# Altium schematic symbol library jlcpcb_2025_04_inductors_extended_0805.schlib: 882 symbols (part 3 of 5) (continued)
## LQM21FN4R7M70L
designator L?  Inductance: 4.7uH
Inductor, 4.7uH, ±20%, 455mΩ, 120mA, SMD 0805; Manufacturer: Murata Electronics; Manufacturer Part Number: LQM21FN4R7M70L; Package Size: 0805; JLCPCB Basic Part: No; JLCPCB Part Number: C162583; Supplier 1: LCSC; Category: Inductors; Supplier Part Number 1: C162583; Tolerance: ±20%; Rated Current: 120mA; Saturation Current: 120mA; DC Resistance: 455mΩ; RoHS: Yes; ComponentLink1Description: Datasheet; ComponentLink1URL: https://wmsc.lcsc.com/wmsc/upload/file/pdf/v2/lcsc/2304140030_Murata-Electronics-LQM21FN4R7M70L_C162583.pdf; ComponentLink2Description: JLCPCB Part URL; ComponentLink2URL: https://jlcpcb.com/partdetail/C162583; ComponentLink3Description: LCSC Part URL; ComponentLink3URL: https://lcsc.com/product-detail/Inductors-SMD_Murata-Electronics-Murata-Electronics-LQM21FN4R7M70L_C162583.html
footprint IND-0805 (0805 (2012M) Inductor)
pins: 1, 2

## LQM21FN4R7M80L
designator L?  Inductance: 4.7uH
Inductor, 4.7uH, ±20%, 234mΩ, 120mA, SMD 0805; Manufacturer: Murata Electronics; Manufacturer Part Number: LQM21FN4R7M80L; Self-Resonant Frequency: 1MHz; Package Size: 0805; JLCPCB Basic Part: No; JLCPCB Part Number: C464406; Supplier 1: LCSC; Category: Inductors; Supplier Part Number 1: C464406; Tolerance: ±20%; Rated Current: 120mA; Saturation Current: 120mA; DC Resistance: 234mΩ; RoHS: Yes; ComponentLink1Description: Datasheet; ComponentLink1URL: https://wmsc.lcsc.com/wmsc/upload/file/pdf/v2/lcsc/1912111437_Murata-Electronics-LQM21FN4R7M80L_C464406.pdf; ComponentLink2Description: JLCPCB Part URL; ComponentLink2URL: https://jlcpcb.com/partdetail/C464406; ComponentLink3Description: LCSC Part URL; ComponentLink3URL: https://lcsc.com/product-detail/Inductors-SMD_Murata-Electronics-Murata-Electronics-LQM21FN4R7M80L_C464406.html
footprint IND-0805 (0805 (2012M) Inductor)
pins: 1, 2

## LQM21FN100M70L
designator L?  Inductance: 10uH
Inductor, 10uH, ±20%, 780mΩ, 100mA, SMD 0805; Manufacturer: Murata Electronics; Manufacturer Part Number: LQM21FN100M70L; Package Size: 0805; JLCPCB Basic Part: No; JLCPCB Part Number: C98030; Supplier 1: LCSC; Category: Inductors; Supplier Part Number 1: C98030; Tolerance: ±20%; Rated Current: 100mA; Saturation Current: 100mA; DC Resistance: 780mΩ; RoHS: Yes; ComponentLink1Description: Datasheet; ComponentLink1URL: https://wmsc.lcsc.com/wmsc/upload/file/pdf/v2/lcsc/1810201221_Murata-Electronics-LQM21FN100M70L_C98030.pdf; ComponentLink2Description: JLCPCB Part URL; ComponentLink2URL: https://jlcpcb.com/partdetail/C98030; ComponentLink3Description: LCSC Part URL; ComponentLink3URL: https://lcsc.com/product-detail/Inductors-SMD_Murata-Electronics-Murata-Electronics-LQM21FN100M70L_C98030.html
footprint IND-0805 (0805 (2012M) Inductor)
pins: 1, 2

## LQM21FN100M80L
designator L?  Inductance: 10uH
Inductor, 10uH, ±20%, 390mΩ, 100mA, SMD 0805; Manufacturer: Murata Electronics; Manufacturer Part Number: LQM21FN100M80L; Self-Resonant Frequency: 1MHz; Package Size: 0805; JLCPCB Basic Part: No; JLCPCB Part Number: C162582; Supplier 1: LCSC; Category: Inductors; Supplier Part Number 1: C162582; Tolerance: ±20%; Rated Current: 100mA; Saturation Current: 100mA; DC Resistance: 390mΩ; RoHS: Yes; ComponentLink1Description: Datasheet; ComponentLink1URL: https://wmsc.lcsc.com/wmsc/upload/file/pdf/v2/lcsc/2304140030_Murata-Electronics-LQM21FN100M80L_C162582.pdf; ComponentLink2Description: JLCPCB Part URL; ComponentLink2URL: https://jlcpcb.com/partdetail/C162582; ComponentLink3Description: LCSC Part URL; ComponentLink3URL: https://lcsc.com/product-detail/Inductors-SMD_Murata-Electronics-Murata-Electronics-LQM21FN100M80L_C162582.html
footprint IND-0805 (0805 (2012M) Inductor)
pins: 1, 2

## LQM21FN100N00L
designator L?  Inductance: 10uH
Inductor, 10uH, ±30%, 650mΩ, 60mA, SMD 0805; Manufacturer: Murata Electronics; Manufacturer Part Number: LQM21FN100N00L; Self-Resonant Frequency: 1MHz; Package Size: 0805; JLCPCB Basic Part: No; JLCPCB Part Number: C113094; Supplier 1: LCSC; Category: Inductors; Supplier Part Number 1: C113094; Tolerance: ±30%; Rated Current: 60mA; Saturation Current: 60mA; DC Resistance: 650mΩ; RoHS: Yes; ComponentLink1Description: Datasheet; ComponentLink1URL: https://wmsc.lcsc.com/wmsc/upload/file/pdf/v2/lcsc/2304140030_Murata-Electronics-LQM21FN100N00L_C113094.pdf; ComponentLink2Description: JLCPCB Part URL; ComponentLink2URL: https://jlcpcb.com/partdetail/C113094; ComponentLink3Description: LCSC Part URL; ComponentLink3URL: https://lcsc.com/product-detail/Inductors-SMD_Murata-Electronics-Murata-Electronics-LQM21FN100N00L_C113094.html
footprint IND-0805 (0805 (2012M) Inductor)
pins: 1, 2

## LQM21FN220N00L
designator L?  Inductance: 22uH
Inductor, 22uH, ±30%, 455mΩ, 13mA, SMD 0805; Manufacturer: Murata Electronics; Manufacturer Part Number: LQM21FN220N00L; Self-Resonant Frequency: 15MHz; Package Size: 0805; JLCPCB Basic Part: No; JLCPCB Part Number: C882482; Supplier 1: LCSC; Category: Inductors; Supplier Part Number 1: C882482; Tolerance: ±30%; Rated Current: 13mA; Saturation Current: 13mA; DC Resistance: 455mΩ; RoHS: Yes; ComponentLink1Description: Datasheet; ComponentLink1URL: https://wmsc.lcsc.com/wmsc/upload/file/pdf/v2/lcsc/2201242130_Murata-Electronics-LQM21FN220N00L_C882482.pdf; ComponentLink2Description: JLCPCB Part URL; ComponentLink2URL: https://jlcpcb.com/partdetail/C882482; ComponentLink3Description: LCSC Part URL; ComponentLink3URL: https://lcsc.com/product-detail/Inductors-SMD_Murata-Electronics-Murata-Electronics-LQM21FN220N00L_C882482.html
footprint IND-0805 (0805 (2012M) Inductor)
pins: 1, 2

## LQM21FN470N00L
designator L?  Inductance: 47uH
Inductor, 47uH, ±30%, 780mΩ, 7mA, SMD 0805; Manufacturer: Murata Electronics; Manufacturer Part Number: LQM21FN470N00L; Self-Resonant Frequency: 1MHz; Package Size: 0805; JLCPCB Basic Part: No; JLCPCB Part Number: C86087; Supplier 1: LCSC; Category: Inductors; Supplier Part Number 1: C86087; Tolerance: ±30%; Rated Current: 7mA; Saturation Current: 7mA; DC Resistance: 780mΩ; RoHS: Yes; ComponentLink1Description: Datasheet; ComponentLink1URL: https://wmsc.lcsc.com/wmsc/upload/file/pdf/v2/lcsc/1810201211_Murata-Electronics-LQM21FN470N00L_C86087.pdf; ComponentLink2Description: JLCPCB Part URL; ComponentLink2URL: https://jlcpcb.com/partdetail/C86087; ComponentLink3Description: LCSC Part URL; ComponentLink3URL: https://lcsc.com/product-detail/Inductors-SMD_Murata-Electronics-Murata-Electronics-LQM21FN470N00L_C86087.html
footprint IND-0805 (0805 (2012M) Inductor)
pins: 1, 2

## LQM21NN1R0K10D
designator L?  Inductance: 1uH
Inductor, 1uH, ±10%, 400mΩ, 50mA, SMD 0805; Manufacturer: Murata Electronics; Manufacturer Part Number: LQM21NN1R0K10D; Self-Resonant Frequency: 107MHz; Q Factor: 45@10MHz; Package Size: 0805; JLCPCB Basic Part: No; JLCPCB Part Number: C882481; Supplier 1: LCSC; Category: Inductors; Supplier Part Number 1: C882481; Tolerance: ±10%; Rated Current: 50mA; DC Resistance: 400mΩ; RoHS: Yes; ComponentLink1Description: Datasheet; ComponentLink1URL: https://wmsc.lcsc.com/wmsc/upload/file/pdf/v2/lcsc/2201242130_Murata-Electronics-LQM21NN1R0K10D_C882481.pdf; ComponentLink2Description: JLCPCB Part URL; ComponentLink2URL: https://jlcpcb.com/partdetail/C882481; ComponentLink3Description: LCSC Part URL; ComponentLink3URL: https://lcsc.com/product-detail/Inductors-SMD_Murata-Electronics-Murata-Electronics-LQM21NN1R0K10D_C882481.html
footprint IND-0805 (0805 (2012M) Inductor)
pins: 1, 2

## LQM21NN1R2K10D
designator L?  Inductance: 1.2uH
Inductor, 1.2uH, ±10%, 470mΩ, 50mA, SMD 0805; Manufacturer: Murata Electronics; Manufacturer Part Number: LQM21NN1R2K10D; Self-Resonant Frequency: 97MHz; Q Factor: 45@10MHz; Package Size: 0805; JLCPCB Basic Part: No; JLCPCB Part Number: C882480; Supplier 1: LCSC; Category: Inductors; Supplier Part Number 1: C882480; Tolerance: ±10%; Rated Current: 50mA; DC Resistance: 470mΩ; RoHS: Yes; ComponentLink1Description: Datasheet; ComponentLink1URL: https://wmsc.lcsc.com/wmsc/upload/file/pdf/v2/lcsc/2201242130_Murata-Electronics-LQM21NN1R2K10D_C882480.pdf; ComponentLink2Description: JLCPCB Part URL; ComponentLink2URL: https://jlcpcb.com/partdetail/C882480; ComponentLink3Description: LCSC Part URL; ComponentLink3URL: https://lcsc.com/product-detail/Inductors-SMD_Murata-Electronics-Murata-Electronics-LQM21NN1R2K10D_C882480.html
footprint IND-0805 (0805 (2012M) Inductor)
pins: 1, 2

## LQM21NN1R5K10D
designator L?  Inductance: 1.5uH
Inductor, 1.5uH, ±10%, 500mΩ, 50mA, SMD 0805; Manufacturer: Murata Electronics; Manufacturer Part Number: LQM21NN1R5K10D; Q Factor: 45@10MHz; Package Size: 0805; JLCPCB Basic Part: No; JLCPCB Part Number: C307605; Supplier 1: LCSC; Category: Inductors; Supplier Part Number 1: C307605; Tolerance: ±10%; Rated Current: 50mA; DC Resistance: 500mΩ; RoHS: Yes; ComponentLink1Description: Datasheet; ComponentLink1URL: https://wmsc.lcsc.com/wmsc/upload/file/pdf/v2/lcsc/2304140030_Murata-Electronics-LQM21NN1R5K10D_C307605.pdf; ComponentLink2Description: JLCPCB Part URL; ComponentLink2URL: https://jlcpcb.com/partdetail/C307605; ComponentLink3Description: LCSC Part URL; ComponentLink3URL: https://lcsc.com/product-detail/Inductors-SMD_Murata-Electronics-Murata-Electronics-LQM21NN1R5K10D_C307605.html
footprint IND-0805 (0805 (2012M) Inductor)
pins: 1, 2

## LQM21NN1R8K10D
designator L?  Inductance: 1.8uH
Inductor, 1.8uH, ±10%, 570mΩ, 50mA, SMD 0805; Manufacturer: Murata Electronics; Manufacturer Part Number: LQM21NN1R8K10D; Self-Resonant Frequency: 80MHz; Q Factor: 45@10MHz; Package Size: 0805; JLCPCB Basic Part: No; JLCPCB Part Number: C337912; Supplier 1: LCSC; Category: Inductors; Supplier Part Number 1: C337912; Tolerance: ±10%; Rated Current: 50mA; DC Resistance: 570mΩ; RoHS: Yes; ComponentLink1Description: Datasheet; ComponentLink1URL: https://wmsc.lcsc.com/wmsc/upload/file/pdf/v2/lcsc/2304140030_Murata-Electronics-LQM21NN1R8K10D_C337912.pdf; ComponentLink2Description: JLCPCB Part URL; ComponentLink2URL: https://jlcpcb.com/partdetail/C337912; ComponentLink3Description: LCSC Part URL; ComponentLink3URL: https://lcsc.com/product-detail/Inductors-SMD_Murata-Electronics-Murata-Electronics-LQM21NN1R8K10D_C337912.html
footprint IND-0805 (0805 (2012M) Inductor)
pins: 1, 2

## LQM21NN2R2K10D
designator L?  Inductance: 2.2uH
Inductor, 2.2uH, ±10%, 630mΩ, 30mA, SMD 0805; Manufacturer: Murata Electronics; Manufacturer Part Number: LQM21NN2R2K10D; Self-Resonant Frequency: 71MHz; Q Factor: 45@10MHz; Package Size: 0805; JLCPCB Basic Part: No; JLCPCB Part Number: C440235; Supplier 1: LCSC; Category: Inductors; Supplier Part Number 1: C440235; Tolerance: ±10%; Rated Current: 30mA; DC Resistance: 630mΩ; RoHS: Yes; ComponentLink1Description: Datasheet; ComponentLink1URL: https://wmsc.lcsc.com/wmsc/upload/file/pdf/v2/lcsc/2304140030_Murata-Electronics-LQM21NN2R2K10D_C440235.pdf; ComponentLink2Description: JLCPCB Part URL; ComponentLink2URL: https://jlcpcb.com/partdetail/C440235; ComponentLink3Description: LCSC Part URL; ComponentLink3URL: https://lcsc.com/product-detail/Inductors-SMD_Murata-Electronics-Murata-Electronics-LQM21NN2R2K10D_C440235.html
footprint IND-0805 (0805 (2012M) Inductor)
pins: 1, 2

## LQM21NN3R3K10L
designator L?  Inductance: 3.3uH
Inductor, 3.3uH, ±10%, 800mΩ, 30mA, SMD 0805; Manufacturer: Murata Electronics; Manufacturer Part Number: LQM21NN3R3K10L; Self-Resonant Frequency: 59MHz; Q Factor: 45@10MHz; Package Size: 0805; JLCPCB Basic Part: No; JLCPCB Part Number: C440236; Supplier 1: LCSC; Category: Inductors; Supplier Part Number 1: C440236; Tolerance: ±10%; Rated Current: 30mA; DC Resistance: 800mΩ; RoHS: Yes; ComponentLink1Description: Datasheet; ComponentLink1URL: https://wmsc.lcsc.com/wmsc/upload/file/pdf/v2/lcsc/2304140030_Murata-Electronics-LQM21NN3R3K10L_C440236.pdf; ComponentLink2Description: JLCPCB Part URL; ComponentLink2URL: https://jlcpcb.com/partdetail/C440236; ComponentLink3Description: LCSC Part URL; ComponentLink3URL: https://lcsc.com/product-detail/Inductors-SMD_Murata-Electronics-Murata-Electronics-LQM21NN3R3K10L_C440236.html
footprint IND-0805 (0805 (2012M) Inductor)
pins: 1, 2

## LQM21NN4R7K10L
designator L?  Inductance: 4.7uH
Inductor, 4.7uH, ±10%, 1Ω, 30mA, SMD 0805; Manufacturer: Murata Electronics; Manufacturer Part Number: LQM21NN4R7K10L; Self-Resonant Frequency: 10MHz; Q Factor: 45@10MHz; Package Size: 0805; JLCPCB Basic Part: No; JLCPCB Part Number: C113097; Supplier 1: LCSC; Category: Inductors; Supplier Part Number 1: C113097; Tolerance: ±10%; Rated Current: 30mA; DC Resistance: 1Ω; RoHS: Yes; ComponentLink1Description: Datasheet; ComponentLink1URL: https://wmsc.lcsc.com/wmsc/upload/file/pdf/v2/lcsc/2304140030_Murata-Electronics-LQM21NN4R7K10L_C113097.pdf; ComponentLink2Description: JLCPCB Part URL; ComponentLink2URL: https://jlcpcb.com/partdetail/C113097; ComponentLink3Description: LCSC Part URL; ComponentLink3URL: https://lcsc.com/product-detail/Inductors-SMD_Murata-Electronics-Murata-Electronics-LQM21NN4R7K10L_C113097.html
footprint IND-0805 (0805 (2012M) Inductor)
pins: 1, 2

## LQM21NNR22K10D
designator L?  Inductance: 220nH
Inductor, 220nH, ±10%, 380mΩ, 250mA, SMD 0805; Manufacturer: Murata Electronics; Manufacturer Part Number: LQM21NNR22K10D; Self-Resonant Frequency: 220MHz; Q Factor: 20@25MHz; Package Size: 0805; JLCPCB Basic Part: No; JLCPCB Part Number: C882477; Supplier 1: LCSC; Category: Inductors; Supplier Part Number 1: C882477; Tolerance: ±10%; Rated Current: 250mA; DC Resistance: 380mΩ; RoHS: Yes; ComponentLink1Description: Datasheet; ComponentLink1URL: https://wmsc.lcsc.com/wmsc/upload/file/pdf/v2/lcsc/2304140030_Murata-Electronics-LQM21NNR22K10D_C882477.pdf; ComponentLink2Description: JLCPCB Part URL; ComponentLink2URL: https://jlcpcb.com/partdetail/C882477; ComponentLink3Description: LCSC Part URL; ComponentLink3URL: https://lcsc.com/product-detail/Inductors-SMD_Murata-Electronics-Murata-Electronics-LQM21NNR22K10D_C882477.html
footprint IND-0805 (0805 (2012M) Inductor)
pins: 1, 2

## LQM21NNR27K10D
designator L?  Inductance: 270nH
Inductor, 270nH, ±10%, 420mΩ, 250mA, SMD 0805; Manufacturer: Murata Electronics; Manufacturer Part Number: LQM21NNR27K10D; Self-Resonant Frequency: 200MHz; Q Factor: 20@25MHz; Package Size: 0805; JLCPCB Basic Part: No; JLCPCB Part Number: C723885; Supplier 1: LCSC; Category: Inductors; Supplier Part Number 1: C723885; Tolerance: ±10%; Rated Current: 250mA; DC Resistance: 420mΩ; RoHS: Yes; ComponentLink1Description: Datasheet; ComponentLink1URL: https://wmsc.lcsc.com/wmsc/upload/file/pdf/v2/lcsc/2304140030_Murata-Electronics-LQM21NNR27K10D_C723885.pdf; ComponentLink2Description: JLCPCB Part URL; ComponentLink2URL: https://jlcpcb.com/partdetail/C723885; ComponentLink3Description: LCSC Part URL; ComponentLink3URL: https://lcsc.com/product-detail/Inductors-SMD_Murata-Electronics-Murata-Electronics-LQM21NNR27K10D_C723885.html
footprint IND-0805 (0805 (2012M) Inductor)
pins: 1, 2

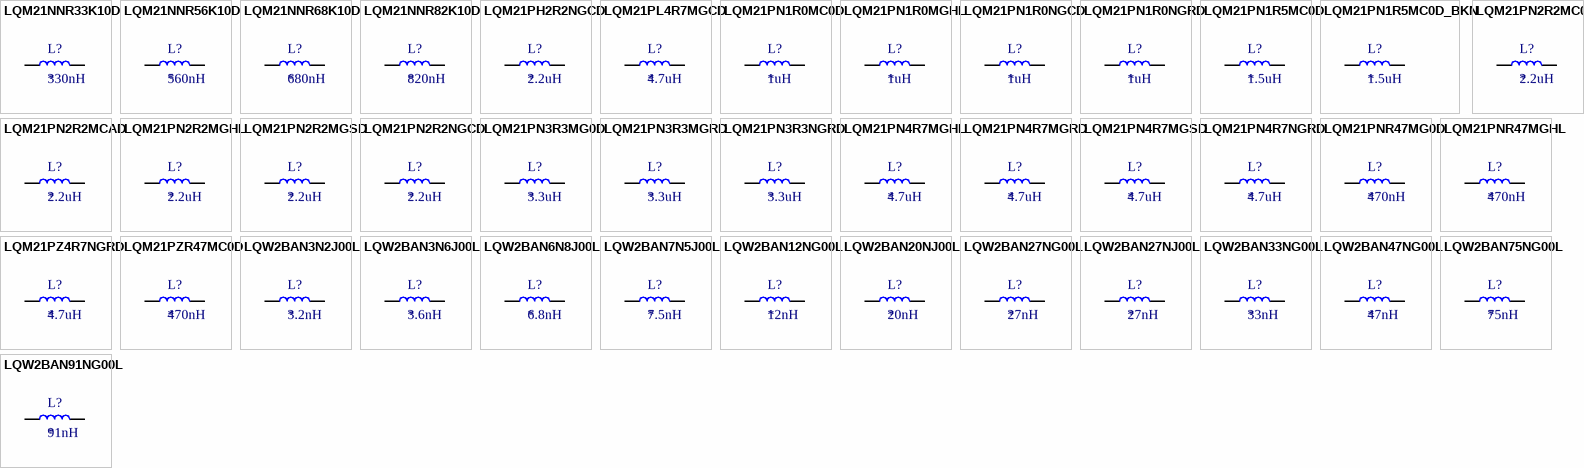
[diagram p11: symbols LQM21NNR33K10D to LQW2BAN91NG00L]

## LQM21NNR33K10D
designator L?  Inductance: 330nH
Inductor, 330nH, ±10%, 480mΩ, 250mA, SMD 0805; Manufacturer: Murata Electronics; Manufacturer Part Number: LQM21NNR33K10D; Self-Resonant Frequency: 180MHz; Q Factor: 20@25MHz; Package Size: 0805; JLCPCB Basic Part: No; JLCPCB Part Number: C882476; Supplier 1: LCSC; Category: Inductors; Supplier Part Number 1: C882476; Tolerance: ±10%; Rated Current: 250mA; DC Resistance: 480mΩ; RoHS: Yes; ComponentLink1Description: Datasheet; ComponentLink1URL: https://wmsc.lcsc.com/wmsc/upload/file/pdf/v2/lcsc/2304140030_Murata-Electronics-LQM21NNR33K10D_C882476.pdf; ComponentLink2Description: JLCPCB Part URL; ComponentLink2URL: https://jlcpcb.com/partdetail/C882476; ComponentLink3Description: LCSC Part URL; ComponentLink3URL: https://lcsc.com/product-detail/Inductors-SMD_Murata-Electronics-Murata-Electronics-LQM21NNR33K10D_C882476.html
footprint IND-0805 (0805 (2012M) Inductor)
pins: 1, 2

## LQM21NNR56K10D
designator L?  Inductance: 560nH
Inductor, 560nH, ±10%, 630mΩ, 150mA, SMD 0805; Manufacturer: Murata Electronics; Manufacturer Part Number: LQM21NNR56K10D; Self-Resonant Frequency: 140MHz; Q Factor: 25@25MHz; Package Size: 0805; JLCPCB Basic Part: No; JLCPCB Part Number: C882475; Supplier 1: LCSC; Category: Inductors; Supplier Part Number 1: C882475; Tolerance: ±10%; Rated Current: 150mA; DC Resistance: 630mΩ; RoHS: Yes; ComponentLink1Description: Datasheet; ComponentLink1URL: https://wmsc.lcsc.com/wmsc/upload/file/pdf/v2/lcsc/2304140030_Murata-Electronics-LQM21NNR56K10D_C882475.pdf; ComponentLink2Description: JLCPCB Part URL; ComponentLink2URL: https://jlcpcb.com/partdetail/C882475; ComponentLink3Description: LCSC Part URL; ComponentLink3URL: https://lcsc.com/product-detail/Inductors-SMD_Murata-Electronics-Murata-Electronics-LQM21NNR56K10D_C882475.html
footprint IND-0805 (0805 (2012M) Inductor)
pins: 1, 2

## LQM21NNR68K10D
designator L?  Inductance: 680nH
Inductor, 680nH, ±10%, 720mΩ, 150mA, SMD 0805; Manufacturer: Murata Electronics; Manufacturer Part Number: LQM21NNR68K10D; Self-Resonant Frequency: 25MHz; Q Factor: 25@25MHz; Package Size: 0805; JLCPCB Basic Part: No; JLCPCB Part Number: C113099; Supplier 1: LCSC; Category: Inductors; Supplier Part Number 1: C113099; Tolerance: ±10%; Rated Current: 150mA; DC Resistance: 720mΩ; RoHS: Yes; ComponentLink1Description: Datasheet; ComponentLink1URL: https://wmsc.lcsc.com/wmsc/upload/file/pdf/v2/lcsc/1810201223_Murata-Electronics-LQM21NNR68K10D_C113099.pdf; ComponentLink2Description: JLCPCB Part URL; ComponentLink2URL: https://jlcpcb.com/partdetail/C113099; ComponentLink3Description: LCSC Part URL; ComponentLink3URL: https://lcsc.com/product-detail/Inductors-SMD_Murata-Electronics-Murata-Electronics-LQM21NNR68K10D_C113099.html
footprint IND-0805 (0805 (2012M) Inductor)
pins: 1, 2

## LQM21NNR82K10D
designator L?  Inductance: 820nH
Inductor, 820nH, ±10%, 810mΩ, 150mA, SMD 0805; Manufacturer: Murata Electronics; Manufacturer Part Number: LQM21NNR82K10D; Self-Resonant Frequency: 25MHz; Q Factor: 25@25MHz; Package Size: 0805; JLCPCB Basic Part: No; JLCPCB Part Number: C98032; Supplier 1: LCSC; Category: Inductors; Supplier Part Number 1: C98032; Tolerance: ±10%; Rated Current: 150mA; DC Resistance: 810mΩ; RoHS: Yes; ComponentLink1Description: Datasheet; ComponentLink1URL: https://wmsc.lcsc.com/wmsc/upload/file/pdf/v2/lcsc/2304140030_Murata-Electronics-LQM21NNR82K10D_C98032.pdf; ComponentLink2Description: JLCPCB Part URL; ComponentLink2URL: https://jlcpcb.com/partdetail/C98032; ComponentLink3Description: LCSC Part URL; ComponentLink3URL: https://lcsc.com/product-detail/Inductors-SMD_Murata-Electronics-Murata-Electronics-LQM21NNR82K10D_C98032.html
footprint IND-0805 (0805 (2012M) Inductor)
pins: 1, 2

## LQM21PH2R2NGCD
designator L?  Inductance: 2.2uH
Inductor, 2.2uH, ±30%, 230mΩ, 800mA, SMD 0805; Manufacturer: Murata Electronics; Manufacturer Part Number: LQM21PH2R2NGCD; Self-Resonant Frequency: 40MHz; Package Size: 0805; JLCPCB Basic Part: No; JLCPCB Part Number: C2042634; Supplier 1: LCSC; Category: Inductors; Supplier Part Number 1: C2042634; Tolerance: ±30%; Rated Current: 800mA; DC Resistance: 230mΩ; RoHS: Yes; ComponentLink1Description: Datasheet; ComponentLink1URL: https://wmsc.lcsc.com/wmsc/upload/file/pdf/v2/lcsc/2202010030_Murata-Electronics-LQM21PH2R2NGCD_C2042634.pdf; ComponentLink2Description: JLCPCB Part URL; ComponentLink2URL: https://jlcpcb.com/partdetail/C2042634; ComponentLink3Description: LCSC Part URL; ComponentLink3URL: https://lcsc.com/product-detail/Inductors-SMD_Murata-Electronics-Murata-Electronics-LQM21PH2R2NGCD_C2042634.html
footprint IND-0805 (0805 (2012M) Inductor)
pins: 1, 2

## LQM21PL4R7MGCD
designator L?  Inductance: 4.7uH
Inductor, 4.7uH, ±20%, 812mΩ, 500mA, SMD 0805; Manufacturer: Murata Electronics; Manufacturer Part Number: LQM21PL4R7MGCD; Package Size: 0805; JLCPCB Basic Part: No; JLCPCB Part Number: C86088; Supplier 1: LCSC; Category: Inductors; Supplier Part Number 1: C86088; Tolerance: ±20%; Rated Current: 500mA; DC Resistance: 812mΩ; RoHS: Yes; ComponentLink1Description: Datasheet; ComponentLink1URL: https://wmsc.lcsc.com/wmsc/upload/file/pdf/v2/lcsc/1810201210_Murata-Electronics-LQM21PL4R7MGCD_C86088.pdf; ComponentLink2Description: JLCPCB Part URL; ComponentLink2URL: https://jlcpcb.com/partdetail/C86088; ComponentLink3Description: LCSC Part URL; ComponentLink3URL: https://lcsc.com/product-detail/Inductors-SMD_Murata-Electronics-Murata-Electronics-LQM21PL4R7MGCD_C86088.html
footprint IND-0805 (0805 (2012M) Inductor)
pins: 1, 2

## LQM21PN1R0MC0D
designator L?  Inductance: 1uH
Inductor, 1uH, ±20%, 238mΩ, 800mA, SMD 0805; Manufacturer: Murata Electronics; Manufacturer Part Number: LQM21PN1R0MC0D; Package Size: 0805; JLCPCB Basic Part: No; JLCPCB Part Number: C113100; Supplier 1: LCSC; Category: Inductors; Supplier Part Number 1: C113100; Tolerance: ±20%; Rated Current: 800mA; DC Resistance: 238mΩ; RoHS: Yes; ComponentLink1Description: Datasheet; ComponentLink1URL: https://wmsc.lcsc.com/wmsc/upload/file/pdf/v2/lcsc/2304140030_Murata-Electronics-LQM21PN1R0MC0D_C113100.pdf; ComponentLink2Description: JLCPCB Part URL; ComponentLink2URL: https://jlcpcb.com/partdetail/C113100; ComponentLink3Description: LCSC Part URL; ComponentLink3URL: https://lcsc.com/product-detail/Inductors-SMD_Murata-Electronics-Murata-Electronics-LQM21PN1R0MC0D_C113100.html
footprint IND-0805 (0805 (2012M) Inductor)
pins: 1, 2

## LQM21PN1R0MGHL
designator L?  Inductance: 1uH
Inductor, 1uH, ±20%, 80mΩ, 1.1A, SMD 0805; Manufacturer: Murata Electronics; Manufacturer Part Number: LQM21PN1R0MGHL; Self-Resonant Frequency: 60MHz; Package Size: 0805; JLCPCB Basic Part: No; JLCPCB Part Number: C703134; Supplier 1: LCSC; Category: Inductors; Supplier Part Number 1: C703134; Tolerance: ±20%; Rated Current: 1.1A; Saturation Current: 1.1A; DC Resistance: 80mΩ; RoHS: Yes; ComponentLink1Description: Datasheet; ComponentLink1URL: https://wmsc.lcsc.com/wmsc/upload/file/pdf/v2/lcsc/2304140030_Murata-Electronics-LQM21PN1R0MGHL_C703134.pdf; ComponentLink2Description: JLCPCB Part URL; ComponentLink2URL: https://jlcpcb.com/partdetail/C703134; ComponentLink3Description: LCSC Part URL; ComponentLink3URL: https://lcsc.com/product-detail/Inductors-SMD_Murata-Electronics-Murata-Electronics-LQM21PN1R0MGHL_C703134.html
footprint IND-0805 (0805 (2012M) Inductor)
pins: 1, 2

## LQM21PN1R0NGCD
designator L?  Inductance: 1uH
Inductor, 1uH, ±30%, 100mΩ, 900mA, SMD 0805; Manufacturer: Murata Electronics; Manufacturer Part Number: LQM21PN1R0NGCD; Self-Resonant Frequency: 50MHz; Package Size: 0805; JLCPCB Basic Part: No; JLCPCB Part Number: C703746; Supplier 1: LCSC; Category: Inductors; Supplier Part Number 1: C703746; Tolerance: ±30%; Rated Current: 900mA; DC Resistance: 100mΩ; RoHS: Yes; ComponentLink1Description: Datasheet; ComponentLink1URL: https://wmsc.lcsc.com/wmsc/upload/file/pdf/v2/lcsc/2304140030_Murata-Electronics-LQM21PN1R0NGCD_C703746.pdf; ComponentLink2Description: JLCPCB Part URL; ComponentLink2URL: https://jlcpcb.com/partdetail/C703746; ComponentLink3Description: LCSC Part URL; ComponentLink3URL: https://lcsc.com/product-detail/Inductors-SMD_Murata-Electronics-Murata-Electronics-LQM21PN1R0NGCD_C703746.html
footprint IND-0805 (0805 (2012M) Inductor)
pins: 1, 2

## LQM21PN1R0NGRD
designator L?  Inductance: 1uH
Inductor, 1uH, ±30%, 66mΩ, 700mA, SMD 0805; Manufacturer: Murata Electronics; Manufacturer Part Number: LQM21PN1R0NGRD; Self-Resonant Frequency: 50MHz; Package Size: 0805; JLCPCB Basic Part: No; JLCPCB Part Number: C703146; Supplier 1: LCSC; Category: Inductors; Supplier Part Number 1: C703146; Tolerance: ±30%; Rated Current: 700mA; DC Resistance: 66mΩ; RoHS: Yes; ComponentLink1Description: Datasheet; ComponentLink1URL: https://wmsc.lcsc.com/wmsc/upload/file/pdf/v2/lcsc/2304140030_Murata-Electronics-LQM21PN1R0NGRD_C703146.pdf; ComponentLink2Description: JLCPCB Part URL; ComponentLink2URL: https://jlcpcb.com/partdetail/C703146; ComponentLink3Description: LCSC Part URL; ComponentLink3URL: https://lcsc.com/product-detail/Inductors-SMD_Murata-Electronics-Murata-Electronics-LQM21PN1R0NGRD_C703146.html
footprint IND-0805 (0805 (2012M) Inductor)
pins: 1, 2

## LQM21PN1R5MC0D
designator L?  Inductance: 1.5uH
Inductor, 1.5uH, ±20%, 260mΩ, 700mA, SMD 0805; Manufacturer: Murata Electronics; Manufacturer Part Number: LQM21PN1R5MC0D; Self-Resonant Frequency: 70MHz; Package Size: 0805; JLCPCB Basic Part: No; JLCPCB Part Number: C576541; Supplier 1: LCSC; Category: Inductors; Supplier Part Number 1: C576541; Tolerance: ±20%; Rated Current: 700mA; DC Resistance: 260mΩ; RoHS: Yes; ComponentLink1Description: Datasheet; ComponentLink1URL: https://wmsc.lcsc.com/wmsc/upload/file/pdf/v2/lcsc/2304140030_Murata-Electronics-LQM21PN1R5MC0D_C576541.pdf; ComponentLink2Description: JLCPCB Part URL; ComponentLink2URL: https://jlcpcb.com/partdetail/C576541; ComponentLink3Description: LCSC Part URL; ComponentLink3URL: https://lcsc.com/product-detail/Inductors-SMD_Murata-Electronics-Murata-Electronics-LQM21PN1R5MC0D_C576541.html
footprint IND-0805 (0805 (2012M) Inductor)
pins: 1, 2

## LQM21PN1R5MC0D_BKN
designator L?  Inductance: 1.5uH
Inductor, 1.5uH, ±20%, 325mΩ, 700mA, SMD 0805; Manufacturer: Murata Electronics; Manufacturer Part Number: LQM21PN1R5MC0D/BKN; Package Size: 0805; JLCPCB Basic Part: No; JLCPCB Part Number: C184208; Supplier 1: LCSC; Category: Inductors; Supplier Part Number 1: C184208; Tolerance: ±20%; Rated Current: 700mA; DC Resistance: 325mΩ; RoHS: Yes; ComponentLink1Description: Datasheet; ComponentLink1URL: https://wmsc.lcsc.com/wmsc/upload/file/pdf/v2/lcsc/1810201251_Murata-Electronics-LQM21PN1R5MC0D-BKN_C184208.pdf; ComponentLink2Description: JLCPCB Part URL; ComponentLink2URL: https://jlcpcb.com/partdetail/C184208; ComponentLink3Description: LCSC Part URL; ComponentLink3URL: https://lcsc.com/product-detail/Inductors-SMD_Murata-Electronics-Murata-Electronics-LQM21PN1R5MC0D-BKN_C184208.html
footprint IND-0805 (0805 (2012M) Inductor)
pins: 1, 2

## LQM21PN2R2MC0D
designator L?  Inductance: 2.2uH
Inductor, 2.2uH, ±20%, 425mΩ, 600mA, SMD 0805; Manufacturer: Murata Electronics; Manufacturer Part Number: LQM21PN2R2MC0D; Self-Resonant Frequency: 1MHz; Package Size: 0805; JLCPCB Basic Part: No; JLCPCB Part Number: C98033; Supplier 1: LCSC; Category: Inductors; Supplier Part Number 1: C98033; Tolerance: ±20%; Rated Current: 600mA; DC Resistance: 425mΩ; RoHS: Yes; ComponentLink1Description: Datasheet; ComponentLink1URL: https://wmsc.lcsc.com/wmsc/upload/file/pdf/v2/lcsc/1810201234_Murata-Electronics-LQM21PN2R2MC0D_C98033.pdf; ComponentLink2Description: JLCPCB Part URL; ComponentLink2URL: https://jlcpcb.com/partdetail/C98033; ComponentLink3Description: LCSC Part URL; ComponentLink3URL: https://lcsc.com/product-detail/Inductors-SMD_Murata-Electronics-Murata-Electronics-LQM21PN2R2MC0D_C98033.html
footprint IND-0805 (0805 (2012M) Inductor)
pins: 1, 2

## LQM21PN2R2MCAD
designator L?  Inductance: 2.2uH
Inductor, 2.2uH, ±20%, 200mΩ, SMD 0805; Manufacturer: Murata Electronics; Manufacturer Part Number: LQM21PN2R2MCAD; Saturation Current: 300mA; Self-Resonant Frequency: 40MHz; Package Size: 0805; JLCPCB Basic Part: No; JLCPCB Part Number: C703745; Supplier 1: LCSC; Category: Inductors; Supplier Part Number 1: C703745; Tolerance: ±20%; DC Resistance: 200mΩ; RoHS: Yes; ComponentLink1Description: Datasheet; ComponentLink1URL: https://wmsc.lcsc.com/wmsc/upload/file/pdf/v2/lcsc/2304140030_Murata-Electronics-LQM21PN2R2MCAD_C703745.pdf; ComponentLink2Description: JLCPCB Part URL; ComponentLink2URL: https://jlcpcb.com/partdetail/C703745; ComponentLink3Description: LCSC Part URL; ComponentLink3URL: https://lcsc.com/product-detail/Inductors-SMD_Murata-Electronics-Murata-Electronics-LQM21PN2R2MCAD_C703745.html
footprint IND-0805 (0805 (2012M) Inductor)
pins: 1, 2

## LQM21PN2R2MGHL
designator L?  Inductance: 2.2uH
Inductor, 2.2uH, ±20%, 125mΩ, 1.3A, SMD 0805; Manufacturer: Murata Electronics; Manufacturer Part Number: LQM21PN2R2MGHL; Saturation Current: 450mA; Self-Resonant Frequency: 40MHz; Package Size: 0805; JLCPCB Basic Part: No; JLCPCB Part Number: C341781; Supplier 1: LCSC; Category: Inductors; Supplier Part Number 1: C341781; Tolerance: ±20%; Rated Current: 1.3A; DC Resistance: 125mΩ; RoHS: Yes; ComponentLink1Description: Datasheet; ComponentLink1URL: https://wmsc.lcsc.com/wmsc/upload/file/pdf/v2/lcsc/2304140030_Murata-Electronics-LQM21PN2R2MGHL_C341781.pdf; ComponentLink2Description: JLCPCB Part URL; ComponentLink2URL: https://jlcpcb.com/partdetail/C341781; ComponentLink3Description: LCSC Part URL; ComponentLink3URL: https://lcsc.com/product-detail/Inductors-SMD_Murata-Electronics-Murata-Electronics-LQM21PN2R2MGHL_C341781.html
footprint IND-0805 (0805 (2012M) Inductor)
pins: 1, 2

## LQM21PN2R2MGSD
designator L?  Inductance: 2.2uH
Inductor, 2.2uH, ±20%, 180mΩ, 950mA, SMD 0805; Manufacturer: Murata Electronics; Manufacturer Part Number: LQM21PN2R2MGSD; Self-Resonant Frequency: 40MHz; Package Size: 0805; JLCPCB Basic Part: No; JLCPCB Part Number: C711165; Supplier 1: LCSC; Category: Inductors; Supplier Part Number 1: C711165; Tolerance: ±20%; Rated Current: 950mA; DC Resistance: 180mΩ; RoHS: Yes; ComponentLink1Description: Datasheet; ComponentLink1URL: https://wmsc.lcsc.com/wmsc/upload/file/pdf/v2/lcsc/2104061735_Murata-Electronics-LQM21PN2R2MGSD_C711165.pdf; ComponentLink2Description: JLCPCB Part URL; ComponentLink2URL: https://jlcpcb.com/partdetail/C711165; ComponentLink3Description: LCSC Part URL; ComponentLink3URL: https://lcsc.com/product-detail/Inductors-SMD_Murata-Electronics-Murata-Electronics-LQM21PN2R2MGSD_C711165.html
footprint IND-0805 (0805 (2012M) Inductor)
pins: 1, 2

## LQM21PN2R2NGCD
designator L?  Inductance: 2.2uH
Inductor, 2.2uH, ±30%, 288mΩ, 800mA, SMD 0805; Manufacturer: Murata Electronics; Manufacturer Part Number: LQM21PN2R2NGCD; Self-Resonant Frequency: 1MHz; Package Size: 0805; JLCPCB Basic Part: No; JLCPCB Part Number: C86089; Supplier 1: LCSC; Category: Inductors; Supplier Part Number 1: C86089; Tolerance: ±30%; Rated Current: 800mA; DC Resistance: 288mΩ; RoHS: Yes; ComponentLink1Description: Datasheet; ComponentLink1URL: https://wmsc.lcsc.com/wmsc/upload/file/pdf/v2/lcsc/1810201242_Murata-Electronics-LQM21PN2R2NGCD_C86089.pdf; ComponentLink2Description: JLCPCB Part URL; ComponentLink2URL: https://jlcpcb.com/partdetail/C86089; ComponentLink3Description: LCSC Part URL; ComponentLink3URL: https://lcsc.com/product-detail/Inductors-SMD_Murata-Electronics-Murata-Electronics-LQM21PN2R2NGCD_C86089.html
footprint IND-0805 (0805 (2012M) Inductor)
pins: 1, 2

## LQM21PN3R3MG0D
designator L?  Inductance: 3.3uH
Inductor, 3.3uH, ±20%, 165mΩ, 800mA, SMD 0805; Manufacturer: Murata Electronics; Manufacturer Part Number: LQM21PN3R3MG0D; Self-Resonant Frequency: 30MHz; Package Size: 0805; JLCPCB Basic Part: No; JLCPCB Part Number: C1333100; Supplier 1: LCSC; Category: Inductors; Supplier Part Number 1: C1333100; Tolerance: ±20%; Rated Current: 800mA; DC Resistance: 165mΩ; RoHS: Yes; ComponentLink1Description: Datasheet; ComponentLink1URL: https://wmsc.lcsc.com/wmsc/upload/file/pdf/v2/lcsc/2105100540_Murata-Electronics-LQM21PN3R3MG0D_C1333100.pdf; ComponentLink2Description: JLCPCB Part URL; ComponentLink2URL: https://jlcpcb.com/partdetail/C1333100; ComponentLink3Description: LCSC Part URL; ComponentLink3URL: https://lcsc.com/product-detail/Inductors-SMD_Murata-Electronics-Murata-Electronics-LQM21PN3R3MG0D_C1333100.html
footprint IND-0805 (0805 (2012M) Inductor)
pins: 1, 2

## LQM21PN3R3MGRD
designator L?  Inductance: 3.3uH
Inductor, 3.3uH, ±20%, 187.5mΩ, 1A, SMD 0805; Manufacturer: Murata Electronics; Manufacturer Part Number: LQM21PN3R3MGRD; Self-Resonant Frequency: 30MHz; Package Size: 0805; JLCPCB Basic Part: No; JLCPCB Part Number: C162585; Supplier 1: LCSC; Category: Inductors; Supplier Part Number 1: C162585; Tolerance: ±20%; Rated Current: 1A; DC Resistance: 187.5mΩ; RoHS: Yes; ComponentLink1Description: Datasheet; ComponentLink1URL: https://wmsc.lcsc.com/wmsc/upload/file/pdf/v2/lcsc/1810201330_Murata-Electronics-LQM21PN3R3MGRD_C162585.pdf; ComponentLink2Description: JLCPCB Part URL; ComponentLink2URL: https://jlcpcb.com/partdetail/C162585; ComponentLink3Description: LCSC Part URL; ComponentLink3URL: https://lcsc.com/product-detail/Inductors-SMD_Murata-Electronics-Murata-Electronics-LQM21PN3R3MGRD_C162585.html
footprint IND-0805 (0805 (2012M) Inductor)
pins: 1, 2

## LQM21PN3R3NGRD
designator L?  Inductance: 3.3uH
Inductor, 3.3uH, ±30%, 187.5mΩ, 1A, SMD 0805; Manufacturer: Murata Electronics; Manufacturer Part Number: LQM21PN3R3NGRD; Self-Resonant Frequency: 30MHz; Package Size: 0805; JLCPCB Basic Part: No; JLCPCB Part Number: C162586; Supplier 1: LCSC; Category: Inductors; Supplier Part Number 1: C162586; Tolerance: ±30%; Rated Current: 1A; DC Resistance: 187.5mΩ; RoHS: Yes; ComponentLink1Description: Datasheet; ComponentLink1URL: https://wmsc.lcsc.com/wmsc/upload/file/pdf/v2/lcsc/2304140030_Murata-Electronics-LQM21PN3R3NGRD_C162586.pdf; ComponentLink2Description: JLCPCB Part URL; ComponentLink2URL: https://jlcpcb.com/partdetail/C162586; ComponentLink3Description: LCSC Part URL; ComponentLink3URL: https://lcsc.com/product-detail/Inductors-SMD_Murata-Electronics-Murata-Electronics-LQM21PN3R3NGRD_C162586.html
footprint IND-0805 (0805 (2012M) Inductor)
pins: 1, 2

## LQM21PN4R7MGHL
designator L?  Inductance: 4.7uH
Inductor, 4.7uH, ±20%, 220mΩ, 250mA, SMD 0805; Manufacturer: Murata Electronics; Manufacturer Part Number: LQM21PN4R7MGHL; Self-Resonant Frequency: 20MHz; Package Size: 0805; JLCPCB Basic Part: No; JLCPCB Part Number: C337913; Supplier 1: LCSC; Category: Inductors; Supplier Part Number 1: C337913; Tolerance: ±20%; Rated Current: 250mA; Saturation Current: 250mA; DC Resistance: 220mΩ; RoHS: Yes; ComponentLink1Description: Datasheet; ComponentLink1URL: https://wmsc.lcsc.com/wmsc/upload/file/pdf/v2/lcsc/1912111437_Murata-Electronics-LQM21PN4R7MGHL_C337913.pdf; ComponentLink2Description: JLCPCB Part URL; ComponentLink2URL: https://jlcpcb.com/partdetail/C337913; ComponentLink3Description: LCSC Part URL; ComponentLink3URL: https://lcsc.com/product-detail/Inductors-SMD_Murata-Electronics-Murata-Electronics-LQM21PN4R7MGHL_C337913.html
footprint IND-0805 (0805 (2012M) Inductor)
pins: 1, 2

## LQM21PN4R7MGRD
designator L?  Inductance: 4.7uH
Inductor, 4.7uH, ±20%, 288mΩ, 800mA, SMD 0805; Manufacturer: Murata Electronics; Manufacturer Part Number: LQM21PN4R7MGRD; Package Size: 0805; JLCPCB Basic Part: No; JLCPCB Part Number: C86090; Supplier 1: LCSC; Category: Inductors; Supplier Part Number 1: C86090; Tolerance: ±20%; Rated Current: 800mA; DC Resistance: 288mΩ; RoHS: Yes; ComponentLink1Description: Datasheet; ComponentLink1URL: https://wmsc.lcsc.com/wmsc/upload/file/pdf/v2/lcsc/1810201221_Murata-Electronics-LQM21PN4R7MGRD_C86090.pdf; ComponentLink2Description: JLCPCB Part URL; ComponentLink2URL: https://jlcpcb.com/partdetail/C86090; ComponentLink3Description: LCSC Part URL; ComponentLink3URL: https://lcsc.com/product-detail/Inductors-SMD_Murata-Electronics-Murata-Electronics-LQM21PN4R7MGRD_C86090.html
footprint IND-0805 (0805 (2012M) Inductor)
pins: 1, 2

## LQM21PN4R7MGSD
designator L?  Inductance: 4.7uH
Inductor, 4.7uH, ±20%, 290mΩ, 750mA, SMD 0805; Manufacturer: Murata Electronics; Manufacturer Part Number: LQM21PN4R7MGSD; Self-Resonant Frequency: 20MHz; Package Size: 0805; JLCPCB Basic Part: No; JLCPCB Part Number: C703145; Supplier 1: LCSC; Category: Inductors; Supplier Part Number 1: C703145; Tolerance: ±20%; Rated Current: 750mA; DC Resistance: 290mΩ; RoHS: Yes; ComponentLink1Description: Datasheet; ComponentLink1URL: https://wmsc.lcsc.com/wmsc/upload/file/pdf/v2/lcsc/2304140030_Murata-Electronics-LQM21PN4R7MGSD_C703145.pdf; ComponentLink2Description: JLCPCB Part URL; ComponentLink2URL: https://jlcpcb.com/partdetail/C703145; ComponentLink3Description: LCSC Part URL; ComponentLink3URL: https://lcsc.com/product-detail/Inductors-SMD_Murata-Electronics-Murata-Electronics-LQM21PN4R7MGSD_C703145.html
footprint IND-0805 (0805 (2012M) Inductor)
pins: 1, 2

## LQM21PN4R7NGRD
designator L?  Inductance: 4.7uH
Inductor, 4.7uH, ±30%, 230mΩ, 800mA, SMD 0805; Manufacturer: Murata Electronics; Manufacturer Part Number: LQM21PN4R7NGRD; Package Size: 0805; JLCPCB Basic Part: No; JLCPCB Part Number: C397305; Supplier 1: LCSC; Category: Inductors; Supplier Part Number 1: C397305; Tolerance: ±30%; Rated Current: 800mA; DC Resistance: 230mΩ; RoHS: Yes; ComponentLink1Description: Datasheet; ComponentLink1URL: https://wmsc.lcsc.com/wmsc/upload/file/pdf/v2/lcsc/1912111437_Murata-Electronics-LQM21PN4R7NGRD_C397305.pdf; ComponentLink2Description: JLCPCB Part URL; ComponentLink2URL: https://jlcpcb.com/partdetail/C397305; ComponentLink3Description: LCSC Part URL; ComponentLink3URL: https://lcsc.com/product-detail/Inductors-SMD_Murata-Electronics-Murata-Electronics-LQM21PN4R7NGRD_C397305.html
footprint IND-0805 (0805 (2012M) Inductor)
pins: 1, 2

## LQM21PNR47MG0D
designator L?  Inductance: 470nH
Inductor, 470nH, ±20%, 75mΩ, 1.3A, SMD 0805; Manufacturer: Murata Electronics; Manufacturer Part Number: LQM21PNR47MG0D; Self-Resonant Frequency: 100MHz; Package Size: 0805; JLCPCB Basic Part: No; JLCPCB Part Number: C337914; Supplier 1: LCSC; Category: Inductors; Supplier Part Number 1: C337914; Tolerance: ±20%; Rated Current: 1.3A; DC Resistance: 75mΩ; RoHS: Yes; ComponentLink1Description: Datasheet; ComponentLink1URL: https://wmsc.lcsc.com/wmsc/upload/file/pdf/v2/lcsc/2304140030_Murata-Electronics-LQM21PNR47MG0D_C337914.pdf; ComponentLink2Description: JLCPCB Part URL; ComponentLink2URL: https://jlcpcb.com/partdetail/C337914; ComponentLink3Description: LCSC Part URL; ComponentLink3URL: https://lcsc.com/product-detail/Inductors-SMD_Murata-Electronics-Murata-Electronics-LQM21PNR47MG0D_C337914.html
footprint IND-0805 (0805 (2012M) Inductor)
pins: 1, 2

## LQM21PNR47MGHL
designator L?  Inductance: 470nH
Inductor, 470nH, ±20%, 40mΩ, 1.3A, SMD 0805; Manufacturer: Murata Electronics; Manufacturer Part Number: LQM21PNR47MGHL; Saturation Current: 1.8A; Self-Resonant Frequency: 80MHz; Package Size: 0805; JLCPCB Basic Part: No; JLCPCB Part Number: C703133; Supplier 1: LCSC; Category: Inductors; Supplier Part Number 1: C703133; Tolerance: ±20%; Rated Current: 1.3A; DC Resistance: 40mΩ; RoHS: Yes; ComponentLink1Description: Datasheet; ComponentLink1URL: https://wmsc.lcsc.com/wmsc/upload/file/pdf/v2/lcsc/2304140030_Murata-Electronics-LQM21PNR47MGHL_C703133.pdf; ComponentLink2Description: JLCPCB Part URL; ComponentLink2URL: https://jlcpcb.com/partdetail/C703133; ComponentLink3Description: LCSC Part URL; ComponentLink3URL: https://lcsc.com/product-detail/Inductors-SMD_Murata-Electronics-Murata-Electronics-LQM21PNR47MGHL_C703133.html
footprint IND-0805 (0805 (2012M) Inductor)
pins: 1, 2

## LQM21PZ4R7NGRD
designator L?  Inductance: 4.7uH
Inductor, 4.7uH, ±30%, 230mΩ, 800mA, SMD 0805; Manufacturer: Murata Electronics; Manufacturer Part Number: LQM21PZ4R7NGRD; Self-Resonant Frequency: 30MHz; Package Size: 0805; JLCPCB Basic Part: No; JLCPCB Part Number: C1330762; Supplier 1: LCSC; Category: Inductors; Supplier Part Number 1: C1330762; Tolerance: ±30%; Rated Current: 800mA; DC Resistance: 230mΩ; RoHS: Yes; ComponentLink1Description: Datasheet; ComponentLink1URL: https://wmsc.lcsc.com/wmsc/upload/file/pdf/v2/lcsc/2304140030_Murata-Electronics-LQM21PZ4R7NGRD_C1330762.pdf; ComponentLink2Description: JLCPCB Part URL; ComponentLink2URL: https://jlcpcb.com/partdetail/C1330762; ComponentLink3Description: LCSC Part URL; ComponentLink3URL: https://lcsc.com/product-detail/Inductors-SMD_Murata-Electronics-Murata-Electronics-LQM21PZ4R7NGRD_C1330762.html
footprint IND-0805 (0805 (2012M) Inductor)
pins: 1, 2

## LQM21PZR47MC0D
designator L?  Inductance: 470nH
Inductor, 470nH, ±20%, SMD 0805; Manufacturer: Murata Electronics; Manufacturer Part Number: LQM21PZR47MC0D; Package Size: 0805; JLCPCB Basic Part: No; JLCPCB Part Number: C307606; Supplier 1: LCSC; Category: Inductors; Supplier Part Number 1: C307606; Tolerance: ±20%; RoHS: Yes; ComponentLink1Description: Datasheet; ComponentLink1URL: https://wmsc.lcsc.com/wmsc/upload/file/pdf/v2/lcsc/2308111512_Murata-Electronics-LQM21PZR47MC0D_C307606.pdf; ComponentLink2Description: JLCPCB Part URL; ComponentLink2URL: https://jlcpcb.com/partdetail/C307606; ComponentLink3Description: LCSC Part URL; ComponentLink3URL: https://lcsc.com/product-detail/Inductors-SMD_Murata-Electronics-Murata-Electronics-LQM21PZR47MC0D_C307606.html
footprint IND-0805 (0805 (2012M) Inductor)
pins: 1, 2

## LQW2BAN3N2J00L
designator L?  Inductance: 3.2nH
Inductor, 3.2nH, ±5%, 20mΩ, 3.8A, SMD 0805; Manufacturer: Murata Electronics; Manufacturer Part Number: LQW2BAN3N2J00L; Package Size: 0805; JLCPCB Basic Part: No; JLCPCB Part Number: C2043110; Supplier 1: LCSC; Category: Inductors; Supplier Part Number 1: C2043110; Tolerance: ±5%; Rated Current: 3.8A; DC Resistance: 20mΩ; RoHS: Yes; ComponentLink1Description: Datasheet; ComponentLink1URL: https://wmsc.lcsc.com/wmsc/upload/file/pdf/v2/lcsc/2304140030_Murata-Electronics-LQW2BAN3N2J00L_C2043110.pdf; ComponentLink2Description: JLCPCB Part URL; ComponentLink2URL: https://jlcpcb.com/partdetail/C2043110; ComponentLink3Description: LCSC Part URL; ComponentLink3URL: https://lcsc.com/product-detail/Power-Inductors_Murata-Electronics-Murata-Electronics-LQW2BAN3N2J00L_C2043110.html
footprint IND-0805 (0805 (2012M) Inductor)
pins: 1, 2

## LQW2BAN3N6J00L
designator L?  Inductance: 3.6nH
Inductor, 3.6nH, ±5%, 50mΩ, 2A, SMD 0805; Manufacturer: Murata Electronics; Manufacturer Part Number: LQW2BAN3N6J00L; Package Size: 0805; JLCPCB Basic Part: No; JLCPCB Part Number: C2045110; Supplier 1: LCSC; Category: Inductors; Supplier Part Number 1: C2045110; Tolerance: ±5%; Rated Current: 2A; DC Resistance: 50mΩ; RoHS: Yes; ComponentLink1Description: Datasheet; ComponentLink1URL: https://wmsc.lcsc.com/wmsc/upload/file/pdf/v2/lcsc/2304140030_Murata-Electronics-LQW2BAN3N6J00L_C2045110.pdf; ComponentLink2Description: JLCPCB Part URL; ComponentLink2URL: https://jlcpcb.com/partdetail/C2045110; ComponentLink3Description: LCSC Part URL; ComponentLink3URL: https://lcsc.com/product-detail/Power-Inductors_Murata-Electronics-Murata-Electronics-LQW2BAN3N6J00L_C2045110.html
footprint IND-0805 (0805 (2012M) Inductor)
pins: 1, 2

## LQW2BAN6N8J00L
designator L?  Inductance: 6.8nH
Inductor, 6.8nH, ±5%, 30mΩ, 3A, SMD 0805; Manufacturer: Murata Electronics; Manufacturer Part Number: LQW2BAN6N8J00L; Package Size: 0805; JLCPCB Basic Part: No; JLCPCB Part Number: C2042975; Supplier 1: LCSC; Category: Inductors; Supplier Part Number 1: C2042975; Tolerance: ±5%; Rated Current: 3A; DC Resistance: 30mΩ; RoHS: Yes; ComponentLink1Description: Datasheet; ComponentLink1URL: https://wmsc.lcsc.com/wmsc/upload/file/pdf/v2/lcsc/2304140030_Murata-Electronics-LQW2BAN6N8J00L_C2042975.pdf; ComponentLink2Description: JLCPCB Part URL; ComponentLink2URL: https://jlcpcb.com/partdetail/C2042975; ComponentLink3Description: LCSC Part URL; ComponentLink3URL: https://lcsc.com/product-detail/Power-Inductors_Murata-Electronics-Murata-Electronics-LQW2BAN6N8J00L_C2042975.html
footprint IND-0805 (0805 (2012M) Inductor)
pins: 1, 2

## LQW2BAN7N5J00L
designator L?  Inductance: 7.5nH
Inductor, 7.5nH, ±5%, 40mΩ, 2.4A, SMD 0805; Manufacturer: Murata Electronics; Manufacturer Part Number: LQW2BAN7N5J00L; Package Size: 0805; JLCPCB Basic Part: No; JLCPCB Part Number: C2042207; Supplier 1: LCSC; Category: Inductors; Supplier Part Number 1: C2042207; Tolerance: ±5%; Rated Current: 2.4A; DC Resistance: 40mΩ; RoHS: Yes; ComponentLink1Description: Datasheet; ComponentLink1URL: https://wmsc.lcsc.com/wmsc/upload/file/pdf/v2/lcsc/2304140030_Murata-Electronics-LQW2BAN7N5J00L_C2042207.pdf; ComponentLink2Description: JLCPCB Part URL; ComponentLink2URL: https://jlcpcb.com/partdetail/C2042207; ComponentLink3Description: LCSC Part URL; ComponentLink3URL: https://lcsc.com/product-detail/Power-Inductors_Murata-Electronics-Murata-Electronics-LQW2BAN7N5J00L_C2042207.html
footprint IND-0805 (0805 (2012M) Inductor)
pins: 1, 2

## LQW2BAN12NG00L
designator L?  Inductance: 12nH
Inductor, 12nH, ±2%, 40mΩ, 2.4A, SMD 0805; Manufacturer: Murata Electronics; Manufacturer Part Number: LQW2BAN12NG00L; Package Size: 0805; JLCPCB Basic Part: No; JLCPCB Part Number: C2044857; Supplier 1: LCSC; Category: Inductors; Supplier Part Number 1: C2044857; Tolerance: ±2%; Rated Current: 2.4A; DC Resistance: 40mΩ; RoHS: Yes; ComponentLink1Description: Datasheet; ComponentLink1URL: https://wmsc.lcsc.com/wmsc/upload/file/pdf/v2/lcsc/2304140030_Murata-Electronics-LQW2BAN12NG00L_C2044857.pdf; ComponentLink2Description: JLCPCB Part URL; ComponentLink2URL: https://jlcpcb.com/partdetail/C2044857; ComponentLink3Description: LCSC Part URL; ComponentLink3URL: https://lcsc.com/product-detail/Power-Inductors_Murata-Electronics-Murata-Electronics-LQW2BAN12NG00L_C2044857.html
footprint IND-0805 (0805 (2012M) Inductor)
pins: 1, 2

## LQW2BAN20NJ00L
designator L?  Inductance: 20nH
Inductor, 20nH, ±5%, 50mΩ, 2.2A, SMD 0805; Manufacturer: Murata Electronics; Manufacturer Part Number: LQW2BAN20NJ00L; Package Size: 0805; JLCPCB Basic Part: No; JLCPCB Part Number: C2042282; Supplier 1: LCSC; Category: Inductors; Supplier Part Number 1: C2042282; Tolerance: ±5%; Rated Current: 2.2A; DC Resistance: 50mΩ; RoHS: Yes; ComponentLink1Description: Datasheet; ComponentLink1URL: https://wmsc.lcsc.com/wmsc/upload/file/pdf/v2/lcsc/2304140030_Murata-Electronics-LQW2BAN20NJ00L_C2042282.pdf; ComponentLink2Description: JLCPCB Part URL; ComponentLink2URL: https://jlcpcb.com/partdetail/C2042282; ComponentLink3Description: LCSC Part URL; ComponentLink3URL: https://lcsc.com/product-detail/Power-Inductors_Murata-Electronics-Murata-Electronics-LQW2BAN20NJ00L_C2042282.html
footprint IND-0805 (0805 (2012M) Inductor)
pins: 1, 2
